# Altium footprint library 13-IC Packages-1bga1.PcbLib: 72 footprints (part 1 of 6) (continued)
## 424 CSP [mil] "QSC-60X5" (continued)
  round 10 smd mask+0: A12(-216.53,0) A14(-216.53,39.37) A23(-216.53,216.54) AB21(196.85,177.16) AC16(216.54,78.74) AC17(216.54,98.42) AC19(216.54,137.79) B12(-196.85,0) B14(-196.85,39.37) B15(-196.85,59.05) B16(-196.85,78.74) B17(-196.85,98.43) B18(-196.85,118.11) B19(-196.85,137.8) B20(-196.85,157.48) B22(-196.85,196.85) C19(-177.16,137.8) D22(-157.48,196.85) E12(-137.79,0) E14(-137.79,39.37) E19(-137.79,137.8) E22(-137.79,196.85) F11(-118.11,-19.68) F12(-118.11,0) F15(-118.11,59.06) F19(-118.11,137.8) F22(-118.11,196.85) H9(-78.74,-59.05) H10(-78.74,-39.37) H11(-78.74,-19.68) H12(-78.74,0) H13(-78.74,19.69) H14(-78.74,39.37) H15(-78.74,59.06) H19(-78.74,137.79) J6(-59.06,-118.11) J8(-59.05,-78.74) J9(-59.05,-59.05) J10(-59.05,-39.37) J11(-59.05,-19.68) J12(-59.05,0) J13(-59.05,19.69) J14(-59.05,39.37) J15(-59.05,59.06) J18(-59.05,118.11) J22(-59.05,196.85) K6(-39.37,-118.11) K9(-39.37,-59.05) K10(-39.37,-39.37) K11(-39.37,-19.68) K12(-39.37,0) K13(-39.37,19.69) K14(-39.37,39.37) K15(-39.37,59.06) K19(-39.37,137.79) L6(-19.69,-118.11) L9(-19.68,-59.05) L11(-19.68,-19.68) L12(-19.68,0) L13(-19.68,19.69) L14(-19.68,39.37) L15(-19.68,59.06) L22(-19.68,196.85) M10(0,-39.37) M11(0,-19.68) M12(0,0) M13(0,19.69) M14(0,39.37) M15(0,59.05) N6(19.68,-118.11) N10(19.68,-39.37) N11(19.68,-19.68) N12(19.68,0) N13(19.68,19.69) N14(19.68,39.37) N15(19.68,59.05) N16(19.68,78.74) N19(19.69,137.79) P8(39.37,-78.74) P9(39.37,-59.06) P10(39.37,-39.37) P11(39.37,-19.69) P13(39.37,19.68) P14(39.37,39.37) P15(39.37,59.05) R8(59.05,-78.74) R9(59.05,-59.06) R10(59.05,-39.37) R11(59.05,-19.69) R14(59.05,39.37) R15(59.05,59.05) R16(59.05,78.74) T8(78.74,-78.74) T9(78.74,-59.06) T10(78.74,-39.37) T11(78.74,-19.69) T14(78.74,39.37) T15(78.74,59.05) T16(78.74,78.74) T18(78.74,118.11)
Top Overlay:
  circle w1: c-204.18,-203 r9.12
  lines w1: -236.22,-236.22 -236.22,236.22 236.22,236.22 236.22,-236.22 -236.22,-236.22
3D body "424_csp.stp": height 39.76, standoff 0, extent -236,-236.22 236.44,236.22

## 432 CSP [mm]
height 0.75
pads (436):
  oval 0.28x0.25 smd mask+0.051: A1(-4.8,-4.8) A2(-4.8,-4.4) A3(-4.8,-4) A4(-4.8,-3.6) A5(-4.8,-3.2) A6(-4.8,-2.8) A7(-4.8,-2.75) A8(-4.8,-2) A9(-4.8,-1.6) A10(-4.8,-1.2) A11(-4.8,-0.8) A12(-4.8,-0.4) A13(-4.8,0) A14(-4.8,0.4) A15(-4.8,0.8) A16(-4.8,1.2) A17(-4.8,1.6) A18(-4.8,2) A19(-4.8,2.75) A20(-4.8,2.8) A21(-4.8,3.2) A22(-4.8,3.6) A23(-4.8,4) A24(-4.8,4.4) A25(-4.8,4.8) AA2(3.2,-4.4) AA4(3.2,-3.6) AA6(3.2,-2.8) AA7(3.2,-2.75) AA8(3.2,-2) AA9(3.2,-1.6) AA10(3.2,-1.2) AA11(3.2,-0.8) AA12(3.2,-0.4) AA13(3.2,0) AA14(3.2,0.4) AA15(3.2,0.8) AA16(3.2,1.2) AA17(3.2,1.6) AA18(3.2,2) AA19(3.2,2.75) AA20(3.2,2.8) AA21(3.2,3.2) AA22(3.2,3.6) AA24(3.2,4.4) AB2(3.6,-4.4) AB4(3.6,-3.6) AB5(3.6,-3.2) AB6(3.6,-2.8) AB7(3.6,-2.75) AB8(3.6,-2) AB9(3.6,-1.6) AB10(3.6,-1.2) AB11(3.6,-0.8) AB12(3.6,-0.4) AB13(3.6,0) AB14(3.6,0.4) AB15(3.6,0.8) AB16(3.6,1.2) AB17(3.6,1.6) AB18(3.6,2) AB19(3.6,2.75) AB20(3.6,2.8) AB21(3.6,3.2) AB22(3.6,3.6) AB24(3.6,4.4) AC2(4,-4.4) AC24(4,4.4) AD1(4.4,-4.8) AD2(4.4,-4.4) AD3(4.4,-4) AD4(4.4,-3.6) AD5(4.4,-3.2) AD6(4.4,-2.8) AD7(4.4,-2.75) AD8(4.4,-2) AD9(4.4,-1.6) AD10(4.4,-1.2) AD11(4.4,-0.8) AD12(4.4,-0.4) AD13(4.4,0) AD14(4.4,0.4) AD15(4.4,0.8) AD16(4.4,1.2) AD17(4.4,1.6) AD18(4.4,2) AD19(4.4,2.75) AD20(4.4,2.8) AD21(4.4,3.2) AD22(4.4,3.6) AD23(4.4,4) AD24(4.4,4.4) AE1(4.8,-4.8) AE2(4.8,-4.4) AE3(4.8,-4) AE4(4.8,-3.6) AE5(4.8,-3.2) AE6(4.8,-2.8) AE7(4.8,-2.75) AE8(4.8,-2) AE9(4.8,-1.6) AE10(4.8,-1.2) AE11(4.8,-0.8) AE12(4.8,-0.4) AE13(4.8,0) AE14(4.8,0.4) AE15(4.8,0.8) AE16(4.8,1.2) AE17(4.8,1.6) AE18(4.8,2) AE19(4.8,2.75) AE20(4.8,2.8) AE21(4.8,3.2) AE22(4.8,3.6) AE23(4.8,4) AE24(4.8,4.4) B2(-4.4,-4.4) B3(-4.4,-4) B4(-4.4,-3.6) B5(-4.4,-3.2) B6(-4.4,-2.8) B7(-4.4,-2.75) B8(-4.4,-2) B9(-4.4,-1.6) B10(-4.4,-1.2) B11(-4.4,-0.8) B12(-4.4,-0.4) B13(-4.4,0) B14(-4.4,0.4) B15(-4.4,0.8) B16(-4.4,1.2) B17(-4.4,1.6) B18(-4.4,2) B19(-4.4,2.75) B20(-4.4,2.8) B21(-4.4,3.2) B22(-4.4,3.6) B23(-4.4,4) B24(-4.4,4.4) C2(-4,-4.4) C24(-4,4.4) D2(-3.6,-4.4) D4(-3.6,-3.6) D5(-3.6,-3.2) D6(-3.6,-2.8) D7(-3.6,-2.75) D8(-3.6,-2) D9(-3.6,-1.6) D10(-3.6,-1.2) D11(-3.6,-0.8) D12(-3.6,-0.4) D13(-3.6,0) D14(-3.6,0.4) D15(-3.6,0.8) D16(-3.6,1.2) D17(-3.6,1.6) D18(-3.6,2) D19(-3.6,2.75) D20(-3.6,2.8) D22(-3.6,3.6) D24(-3.6,4.4) E2(-3.2,-4.4) E4(-3.2,-3.6) E6(-3.2,-2.8) E7(-3.2,-2.75) E8(-3.2,-2) E9(-3.2,-1.6) E10(-3.2,-1.2) E11(-3.2,-0.8) E12(-3.2,-0.4) E13(-3.2,0) E14(-3.2,0.4) E15(-3.2,0.8) E16(-3.2,1.2) E17(-3.2,1.6) E18(-3.2,2) E19(-3.2,2.75) E20(-3.2,2.8) E21(-3.2,3.2) E22(-3.2,3.6) E24(-3.2,4.4) F2(-2.8,-4.4) F4(-2.8,-3.6) F22(-2.8,3.6) F23(-2.8,4.4) G2(-2.75,-4.4) G4(-2.75,-3.6) G7(-2.75,-2.75) G9(-2.75,-1.6) G10(-2.75,-1.2) G11(-2.75,-0.8) G12(-2.75,-0.4) G13(-2.75,0) G14(-2.75,0.4) G15(-2.75,0.8) G16(-2.75,1.2) G17(-2.75,1.6) G19(-2.75,2.75) G22(-2.75,3.6) G24(-2.75,4.4) H2(-2,-4.4) H4(-2,-3.6) H7(-2,-2.75) H8(-2,-2) H9(-2,-1.6) H10(-2,-1.2) H11(-2,-0.8) H12(-2,-0.4) H13(-2,0) H14(-2,0.4) H15(-2,0.8) H16(-2,1.2) H17(-2,1.6) H18(-2,2) H19(-2,2.75) H22(-2,3.6) H24(-2,4.4) J2(-1.6,-4.4) J4(-1.6,-3.6) J7(-1.6,-2.75) J19(-1.6,2.75) J22(-1.6,3.6) J24(-1.6,4.4) K2(-1.2,-4.4) K4(-1.2,-3.6) K7(-1.2,-2.75) K19(-1.2,2.75) K22(-1.2,3.6) K24(-1.2,4.4) L2(-0.8,-4.4) L4(-0.8,-3.6) L7(-0.8,-2.75) L12(-0.8,-0.4) L13(-0.8,0) L14(-0.8,0.4) L15(-0.8,0.8) L19(-0.8,2.75) L22(-0.8,3.6) L24(-0.8,4.4) M2(-0.4,-4.4) M4(-0.4,-3.6) M7(-0.4,-2.75) M11(-0.4,-0.8) M12(-0.4,-0.4) M13(-0.4,0) M14(-0.4,0.4) M15(-0.4,0.8) M19(-0.4,2.75) M22(-0.4,3.6) M24(-0.4,4.4) N2(0,-4.4) N4(0,-3.6) N7(0,-2.75) N11(0,-0.8) N12(0,-0.4) N13(0,0) N14(0,0.4) N15(0,0.8) N19(0,2.75) N22(0,3.6) N24(0,4.4) P2(0.4,-4.4) P4(0.4,-3.6) P7(0.4,-2.75) P11(0.4,-0.8) P12(0.4,-0.4) P13(0.4,0) P14(0.4,0.4) P15(0.4,0.8) P19(0.4,2.75) P22(0.4,3.6) P24(0.4,4.4) R2(0.8,-4.4) R4(0.8,-3.6) R7(0.8,-2.75) R11(0.8,-0.8) R12(0.8,-0.4) R13(0.8,0) R14(0.8,0.4) R15(0.8,0.8) R19(0.8,2.75) R22(0.8,3.6) R24(0.8,4.4) T2(1.2,-4.4) T4(1.2,-3.6) T7(1.2,-2.75) T19(1.2,2.75) T22(1.2,3.6) T24(1.2,4.4) U2(1.6,-4.4) U4(1.6,-3.6) U7(1.6,-2.75) U19(1.6,2.75) U22(1.6,3.6) U24(1.6,4.4) V2(2,-4.4) V4(2,-3.6) V7(2,-2.75) V8(2,-2) V9(2,-1.6) V10(2,-1.2) V11(2,-0.8) V12(2,-0.4) V13(2,0) V14(2,0.4) V15(2,0.8) V16(2,1.2) V17(2,1.6) V19(2,2.75) V22(2,3.6) V24(2,4.4) W2(2.75,-4.4) W4(2.75,-3.6) W7(2.75,-2.75) W8(2.75,-2) W9(2.75,-1.6) W10(2.75,-1.2) W11(2.75,-0.8) W12(2.75,-0.4) W13(2.75,0) W14(2.75,0.4) W15(2.75,0.8) W16(2.75,1.2) W17(2.75,1.6) W18(2.75,2) W19(2.75,2.75) W22(2.75,3.6) W24(2.75,4.4) Y2(2.8,-4.4) Y4(2.8,-3.6) Y22(2.8,3.6) Y24(2.8,4.4)
  oval 0.25x0.28 smd mask+0.051: AA1(3.2,-4.8) AA5(3.2,-3.2) AA25(3.2,4.8) AB1(3.6,-4.8) AB25(3.6,4.8) AC1(4,-4.8) AC25(4,4.8) AD25(4.4,4.8) AE25(4.8,4.8) B1(-4.4,-4.8) B25(-4.4,4.8) C1(-4,-4.8) C25(-4,4.8) D1(-3.6,-4.8) D21(-3.6,3.2) D25(-3.6,4.8) E1(-3.2,-4.8) E5(-3.2,-3.2) E25(-3.2,4.8) F1(-2.8,-4.8) F5(-2.8,-3.2) F21(-2.8,3.2) F25(-2.8,4.8) G1(-2.75,-4.8) G5(-2.75,-3.2) G8(-2.75,-2) G18(-2.75,2) G21(-2.75,3.2) G25(-2.75,4.8) H1(-2,-4.8) H5(-2,-3.2) H21(-2,3.2) H25(-2,4.8) J1(-1.6,-4.8) J5(-1.6,-3.2) J8(-1.6,-2) J18(-1.6,2) J21(-1.6,3.2) J25(-1.6,4.8) K1(-1.2,-4.8) K5(-1.2,-3.2) K8(-1.2,-2) K18(-1.2,2) K21(-1.2,3.2) K25(-1.2,4.8) L1(-0.8,-4.8) L5(-0.8,-3.2) L8(-0.8,-2) L18(-0.8,2) L21(-0.8,3.2) L25(-0.8,4.8) M1(-0.4,-4.8) M5(-0.4,-3.2) M8(-0.4,-2) M18(-0.4,2) M21(-0.4,3.2) M25(-0.4,4.8) N1(0,-4.8) N5(0,-3.2) N8(0,-2) N18(0,2) N21(0,3.2) N25(0,4.8) P1(0.4,-4.8) P5(0.4,-3.2) P8(0.4,-2) P18(0.4,2) P21(0.4,3.2) P25(0.4,4.8) R1(0.8,-4.8) R5(0.8,-3.2) R8(0.8,-2) R18(0.8,2) R21(0.8,3.2) R25(0.8,4.8) T1(1.2,-4.8) T5(1.2,-3.2) T8(1.2,-2) T18(1.2,2) T21(1.2,3.2) T25(1.2,4.8) U1(1.6,-4.8) U5(1.6,-3.2) U8(1.6,-2) U18(1.6,2) U21(1.6,3.2) U25(1.6,4.8) V1(2,-4.8) V5(2,-3.2) V18(2,2) V21(2,3.2) V25(2,4.8) W1(2.75,-4.8) W5(2.75,-3.2) W21(2.75,3.2) W25(2.75,4.8) Y1(2.8,-4.8) Y5(2.8,-3.2) Y21(2.8,3.2) Y25(2.8,4.8)
  rect 0.178x0.978 smd mask+0.051: ""(-5.639,-5.232) ""(5.639,5.232)
  rect 0.978x0.178 smd mask+0.051: ""(-5.232,-5.639) ""(5.207,5.639)
Top Overlay:
  circle w0.025: c-4.804,-4.801 r0.232
  lines w0.025: -5.5,-5.5 5.5,-5.5 5.5,5.5 -5.5,5.5 -5.5,-5.5
3D body "BGA74C100P11X11_1200X1200X170.stp": height 1.7, standoff 0, extent -6,-6 6,6

## 543 BLL [mm] "MSM7200"
height 0.75
pads (543):
  round 0.285 smd: A1(-6.75,-6.75) A2(-6.75,-6.25) A3(-6.75,-5.75) A4(-6.75,-5.25) A5(-6.75,-4.75) A6(-6.75,-4.25) A7(-6.75,-3.75) A8(-6.75,-3.25) A9(-6.75,-2.75) A10(-6.75,-2.25) A11(-6.75,-1.75) A12(-6.75,-1.25) A13(-6.75,-0.75) A14(-6.75,-0.25) A15(-6.75,0.25) A16(-6.75,0.75) A17(-6.75,1.25) A18(-6.75,1.75) A19(-6.75,2.25) A20(-6.75,2.75) A21(-6.75,3.25) A22(-6.75,3.75) A23(-6.75,4.25) A24(-6.75,4.75) A25(-6.75,5.25) A26(-6.75,5.75) A27(-6.75,6.25) A28(-6.75,6.75) AA1(3.25,-6.75) AA2(3.25,-6.25) AA4(3.25,-5.25) AA5(3.25,-4.75) AA7(3.25,-3.75) AA8(3.25,-3.25) AA9(3.25,-2.75) AA10(3.25,-2.25) AA11(3.25,-1.75) AA12(3.25,-1.25) AA13(3.25,-0.75) AA14(3.25,-0.25) AA15(3.25,0.25) AA16(3.25,0.75) AA17(3.25,1.25) AA18(3.25,1.75) AA19(3.25,2.25) AA20(3.25,2.75) AA21(3.25,3.25) AA22(3.25,3.75) AA24(3.25,4.75) AA25(3.25,5.25) AA27(3.234,6.269) AA28(3.25,6.75) AB1(3.75,-6.75) AB2(3.75,-6.25) AB4(3.75,-5.25) AB5(3.75,-4.75) AB7(3.75,-3.75) AB8(3.75,-3.25) AB9(3.75,-2.75) AB10(3.75,-2.25) AB11(3.75,-1.75) AB12(3.75,-1.25) AB13(3.75,-0.75) AB14(3.75,-0.25) AB15(3.75,0.25) AB16(3.75,0.75) AB17(3.75,1.25) AB18(3.75,1.75) AB19(3.75,2.25) AB20(3.75,2.75) AB21(3.75,3.25) AB22(3.75,3.75) AB24(3.75,4.75) AB25(3.75,5.25) AB27(3.75,6.25) AB28(3.75,6.75) AC1(4.25,-6.75) AC2(4.25,-6.25) AC4(4.25,-5.25) AC5(4.25,-4.75) AC24(4.25,4.75) AC25(4.25,5.25) AC27(4.25,6.25) AC28(4.25,6.75) AD1(4.75,-6.75) AD2(4.75,-6.25) AD4(4.75,-5.25) AD5(4.75,-4.75) AD6(4.75,-4.25) AD7(4.75,-3.75) AD8(4.75,-3.25) AD9(4.75,-2.75) AD10(4.75,-2.25) AD11(4.75,-1.75) AD12(4.75,-1.25) AD13(4.75,-0.75) AD14(4.75,-0.25) AD15(4.75,0.25) AD16(4.75,0.75) AD17(4.75,1.25) AD18(4.75,1.75) AD19(4.75,2.25) AD20(4.75,2.75) AD21(4.75,3.25) AD22(4.75,3.75) AD23(4.75,4.25) AD24(4.75,4.75) AD25(4.75,5.25) AD27(4.75,6.25) AD28(4.75,6.75) AE1(5.25,-6.75) AE2(5.25,-6.25) AE4(5.25,-5.25) AE5(5.25,-4.75) AE6(5.25,-4.25) AE7(5.25,-3.75) AE8(5.25,-3.25) AE9(5.25,-2.75) AE10(5.25,-2.25) AE11(5.25,-1.75) AE12(5.25,-1.25) AE13(5.25,-0.75) AE14(5.25,-0.25) AE15(5.25,0.25) AE16(5.25,0.75) AE17(5.25,1.25) AE18(5.25,1.75) AE19(5.25,2.25) AE20(5.25,2.75) AE21(5.25,3.25) AE22(5.25,3.75) AE23(5.25,4.25) AE24(5.25,4.75) AE25(5.25,5.25) AE27(5.25,6.25) AE28(5.25,6.75) AF1(5.75,-6.75) AF2(5.75,-6.25) AF27(5.75,6.25) AF28(5.75,6.75) AG1(6.25,-6.75) AG2(6.25,-6.25) AG3(6.25,-5.75) AG4(6.25,-5.25) AG5(6.25,-4.75) AG6(6.25,-4.25) AG7(6.25,-3.75) AG8(6.25,-3.25) AG9(6.25,-2.75) AG10(6.25,-2.25) AG11(6.25,-1.75) AG12(6.25,-1.25) AG13(6.25,-0.75) AG14(6.25,-0.25) AG15(6.25,0.25) AG16(6.25,0.75) AG17(6.25,1.25) AG18(6.25,1.75) AG19(6.25,2.25) AG20(6.25,2.75) AG21(6.25,3.25) AG22(6.25,3.75) AG23(6.25,4.25) AG24(6.25,4.75) AG25(6.25,5.25) AG26(6.25,5.75) AG27(6.25,6.25) AG28(6.25,6.75) AH1(6.75,-6.75) AH2(6.75,-6.25) AH3(6.75,-5.75) AH4(6.75,-5.25) AH5(6.75,-4.75) AH6(6.75,-4.25) AH7(6.75,-3.75) AH8(6.75,-3.25) AH9(6.75,-2.75) AH10(6.75,-2.25) AH11(6.75,-1.75) AH12(6.75,-1.25) AH13(6.75,-0.75) AH14(6.75,-0.25) AH15(6.75,0.25) AH16(6.75,0.75) AH17(6.75,1.25) AH18(6.75,1.75) AH19(6.75,2.25) AH20(6.75,2.75) AH21(6.75,3.25) AH22(6.75,3.75) AH23(6.75,4.25) AH24(6.75,4.75) AH25(6.75,5.25) AH26(6.75,5.75) AH27(6.75,6.25) AH28(6.75,6.75) B1(-6.25,-6.75) B2(-6.25,-6.25) B3(-6.25,-5.75) B4(-6.25,-5.25) B5(-6.25,-4.75) B6(-6.25,-4.25) B7(-6.25,-3.75) B8(-6.25,-3.25) B9(-6.25,-2.75) B10(-6.25,-2.25) B11(-6.25,-1.75) B12(-6.25,-1.25) B13(-6.25,-0.75) B14(-6.25,-0.25) B15(-6.25,0.25) B16(-6.25,0.75) B17(-6.25,1.25) B18(-6.25,1.75) B19(-6.25,2.25) B20(-6.25,2.75) B21(-6.25,3.25) B22(-6.25,3.75) B23(-6.25,4.25) B24(-6.25,4.75) B25(-6.25,5.25) B26(-6.25,5.75) B27(-6.25,6.25) B28(-6.25,6.75) C1(-5.75,-6.75) C2(-5.75,-6.25) C28(-5.75,6.75) D1(-5.25,-6.75) D2(-5.25,-6.25) D4(-5.25,-5.25) D5(-5.25,-4.75) D6(-5.25,-4.25) D7(-5.25,-3.75) D8(-5.25,-3.25) D9(-5.25,-2.75) D10(-5.25,-2.25) D11(-5.25,-1.75) D12(-5.25,-1.25) D13(-5.25,-0.75) D14(-5.25,-0.25) D15(-5.25,0.25) D16(-5.25,0.75) D17(-5.25,1.25) D18(-5.25,1.75) D19(-5.25,2.25) D20(-5.25,2.75) D21(-5.25,3.25) D22(-5.25,3.75) D23(-5.25,4.25) D24(-5.25,4.75) D25(-5.25,5.25) D27(-5.25,6.25) D28(-5.25,6.75) E1(-4.75,-6.75) E2(-4.75,-6.25) E4(-4.75,-5.25) E5(-4.75,-4.75) E6(-4.75,-4.25) E7(-4.75,-3.75) E8(-4.75,-3.25) E9(-4.75,-2.75) E10(-4.75,-2.25) E11(-4.75,-1.75) E12(-4.75,-1.25) E13(-4.75,-0.75) E14(-4.75,-0.25) E15(-4.75,0.262) E16(-4.75,0.75) E17(-4.75,1.25) E18(-4.75,1.75) E19(-4.75,2.25) E20(-4.75,2.75) E21(-4.75,3.25) E22(-4.75,3.75) E23(-4.75,4.25) E24(-4.75,4.75) E25(-4.75,5.25) E27(-4.75,6.25) E28(-4.75,6.75) F1(-4.25,-6.75) F2(-4.25,-6.25) F4(-4.25,-5.25) F5(-4.25,-4.75) F24(-4.25,4.75) F25(-4.25,5.25) F27(-4.25,6.25) F28(-4.25,6.75) G1(-3.75,-6.75) G2(-3.75,-6.25) G4(-3.75,-5.25) G5(-3.75,-4.75) G7(-3.75,-3.75) G8(-3.75,-3.25) G9(-3.75,-2.75) G10(-3.75,-2.25) G11(-3.75,-1.75) G12(-3.75,-1.25) G13(-3.75,-0.75) G14(-3.75,-0.25) G15(-3.75,0.25) G16(-3.75,0.75) G17(-3.75,1.25) G18(-3.75,1.75) G19(-3.75,2.25) G20(-3.75,2.75) G21(-3.75,3.25) G22(-3.75,3.75) G24(-3.75,4.75) G25(-3.75,5.25) G27(-3.75,6.25) G28(-3.75,6.75) H1(-3.25,-6.75) H2(-3.25,-6.25) H4(-3.25,-5.25) H5(-3.25,-4.75) H7(-3.25,-3.75) H8(-3.25,-3.25) H9(-3.25,-2.75) H10(-3.25,-2.25) H11(-3.25,-1.75) H12(-3.25,-1.25) H13(-3.25,-0.75) H14(-3.25,-0.25) H15(-3.25,0.25) H16(-3.25,0.75) H17(-3.25,1.25) H18(-3.25,1.75) H20(-3.25,2.75) H21(-3.25,3.25) H22(-3.25,3.75) H24(-3.25,4.75) H25(-3.25,5.25) H27(-3.25,6.25) H28(-3.25,6.75) J1(-2.75,-6.75) J2(-2.75,-6.25) J4(-2.75,-5.25) J5(-2.75,-4.75) J7(-2.75,-3.75) J8(-2.75,-3.25) J21(-2.75,3.25) J22(-2.75,3.75) J24(-2.75,4.75) J25(-2.75,5.25) J27(-2.75,6.25) J28(-2.75,6.75) K1(-2.25,-6.75) K2(-2.25,-6.25) K4(-2.25,-5.25) K5(-2.25,-4.75) K7(-2.25,-3.75) K8(-2.25,-3.25) K21(-2.25,3.25) K22(-2.25,3.75) K24(-2.25,4.75) K25(-2.25,5.25) K27(-2.25,6.25) K28(-2.25,6.75) L1(-1.75,-6.75) L2(-1.75,-6.25) L4(-1.75,-5.25) L5(-1.75,-4.75) L7(-1.75,-3.75) L8(-1.75,-3.25) L12(-1.75,-1.25) L13(-1.75,-0.75) L14(-1.75,-0.25) L15(-1.75,0.25) L16(-1.75,0.75) L17(-1.75,1.25) L18(-1.75,1.75) L21(-1.75,3.25) L22(-1.75,3.75) L24(-1.75,4.75) L25(-1.75,5.25) L27(-1.75,6.25) L28(-1.75,6.75) M1(-1.25,-6.75) M2(-1.25,-6.25) M4(-1.25,-5.25) M5(-1.25,-4.75) M7(-1.25,-3.75) M8(-1.25,-3.25) M11(-1.25,-1.75) M12(-1.25,-1.25) M13(-1.25,-0.75) M14(-1.25,-0.25) M15(-1.25,0.25) M16(-1.25,0.75) M17(-1.25,1.25) M18(-1.25,1.75) M21(-1.25,3.25) M22(-1.25,3.75) M24(-1.25,4.75) M25(-1.25,5.25) M27(-1.25,6.25) M28(-1.25,6.75) N1(-0.75,-6.75) N2(-0.75,-6.25) N4(-0.75,-5.25) N5(-0.75,-4.75) N7(-0.75,-3.75) N8(-0.75,-3.25) N11(-0.75,-1.75) N12(-0.75,-1.25) N13(-0.75,-0.75) N14(-0.75,-0.25) N15(-0.75,0.25) N16(-0.75,0.75) N17(-0.75,1.25) N18(-0.75,1.75) N21(-0.75,3.25) N22(-0.75,3.75) N24(-0.75,4.75) N25(-0.75,5.25) N27(-0.75,6.25) N28(-0.75,6.75) P1(-0.25,-6.75) P2(-0.25,-6.25) P4(-0.25,-5.25) P5(-0.25,-4.75) P7(-0.25,-3.75) P8(-0.25,-3.25) P11(-0.25,-1.75) P12(-0.25,-1.25) P13(-0.25,-0.75) P14(-0.25,-0.25) P15(-0.25,0.25) P16(-0.25,0.75) P17(-0.25,1.25) P18(-0.25,1.75) P21(-0.25,3.25) P22(-0.25,3.75) P24(-0.25,4.75) P25(-0.25,5.25) P27(-0.25,6.25) P28(-0.25,6.75) R1(0.25,-6.75) R2(0.25,-6.25) R4(0.25,-5.25) R5(0.25,-4.75) R7(0.25,-3.75) R8(0.25,-3.25) R11(0.25,-1.75) R12(0.25,-1.25) R13(0.25,-0.75) R14(0.25,-0.25) R15(0.25,0.25) R16(0.25,0.75) R17(0.25,1.25) R18(0.25,1.75) R21(0.25,3.25) R22(0.25,3.75) R24(0.25,4.75) R25(0.25,5.25) R27(0.25,6.25) R28(0.25,6.75) T1(0.75,-6.75) T2(0.75,-6.25) T4(0.75,-5.25) T5(0.75,-4.75) T7(0.75,-3.75) T8(0.75,-3.25) T11(0.75,-1.75) T12(0.75,-1.25) T13(0.75,-0.75) T14(0.75,-0.25) T15(0.75,0.25) T16(0.75,0.75) T17(0.75,1.25) T18(0.75,1.75) T21(0.75,3.25) T22(0.75,3.75) T24(0.75,4.75) T25(0.75,5.25) T27(0.75,6.25) T28(0.75,6.75) U1(1.25,-6.75) U2(1.25,-6.25) U4(1.25,-5.25) U5(1.25,-4.75) U7(1.25,-3.75) U8(1.25,-3.25) U11(1.25,-1.75) U12(1.25,-1.25) U13(1.25,-0.75) U14(1.25,-0.25) U15(1.25,0.25) U16(1.25,0.75) U17(1.25,1.25) U18(1.25,1.75) U21(1.25,3.25) U22(1.25,3.75) U24(1.25,4.75) U25(1.25,5.25) U27(1.25,6.25) U28(1.25,6.75) V1(1.75,-6.75) V2(1.75,-6.25) V4(1.75,-5.25) V5(1.75,-4.75) V7(1.75,-3.75) V8(1.75,-3.25) V11(1.75,-1.75) V12(1.75,-1.25) V13(1.75,-0.75) V14(1.75,-0.25) V15(1.75,0.25) V16(1.75,0.75) V17(1.75,1.25) V18(1.75,1.75) V21(1.75,3.25) V22(1.75,3.75) V24(1.75,4.75) V25(1.75,5.25) V27(-5.75,6.25) V27(1.75,6.25) V28(1.75,6.75) W1(2.25,-6.75) W2(2.25,-6.25) W4(2.25,-5.25) W5(2.25,-4.75) W7(2.25,-3.75) W8(2.25,-3.25) W21(2.25,3.25) W22(2.25,3.75) W24(2.25,4.75) W25(2.25,5.25) W27(2.25,6.25) W28(2.25,6.75) Y1(2.75,-6.75) Y2(2.75,-6.25) Y4(2.75,-5.25) Y5(2.75,-4.75) Y7(2.75,-3.75) Y8(2.75,-3.25) Y21(2.75,3.25) Y22(2.75,3.75) Y24(2.75,4.75) Y25(2.75,5.25) Y27(2.75,6.25) Y28(2.75,6.75)
  round 0.285 smd mask+0.05: H19(-3.25,2.25)
Top Overlay:
  region: -7.5,-7.5 -6.738,-7.5 -7.5,-6.738
  lines w0.005: -7.5,-6.738 -6.738,-7.5 ; -7.5,-7.5 -7.5,7.5 7.5,7.5 7.5,-7.5 -7.5,-7.5
  lines w0.051: -7.671,-7.671 -7.671,7.671 7.671,7.671 7.671,-7.671 -7.671,-7.671
3D body "BGA324C80P18X18_1500X1500X120.stp": height 1.2, standoff 0, extent -7.5,-7.5 7.5,7.5

## BGA8C50P3X3_153X153X63 [mm] "BGA8C50P3X3_153X153X63"
height 23.14
pads (10):
  round 1 smd: " "(-1.85,-1.85) " "(1.85,1.85)
  round 0.35 smd: A1(-0.5,0.5) A2(0,0.5) A3(0.5,0.5) B1(-0.5,0) B3(0.5,0) C1(-0.5,-0.5) C2(0,-0.5) C3(0.5,-0.5)
Top Layer keep-out:
  circle w0.025: c-1.85,-1.85 r1
  circle w0.025: c-1.85,-1.85 r1
  circle w0.025: c1.85,1.85 r1
  circle w0.025: c1.85,1.85 r1
Top Overlay:
  circle w0.254: c-1.531,0.571 r0.279
  lines w0.152: -1,-1 -1,1 1,1 1,-1 -1,-1
Mechanical 16:
  circle w0.025: c-1.531,0.571 r0.279
  lines w0.025: -0.767,-0.767 -0.767,0.767 0.767,0.767 0.767,-0.767 -0.767,-0.767
Mechanical 32:
  text "C3" at 0.5,-1.02 h0.65
  text "B3" at 0.5,-0.52 h0.65
  text "B1" at -0.5,-0.52 h0.65
  text "C1" at -0.5,-1.02 h0.65
  text "A3" at 0.5,-0.02 h0.65
  text "C2" at 0,-1.02 h0.65
  text "A1" at -0.5,-0.02 h0.65
  text "A2" at 0,-0.02 h0.65
  text "1.5344" at -6.054,0.154 h0.76
  text ".0604" at -5.668,-0.657 h0.76
  text "0.5" at -0.93,4.202 h0.76
  text ".0197" at -1.576,3.391 h0.76
  text "0.5" at 4.029,-0.571 h0.76
  text ".0197" at 6.823,-0.571 h0.76
  text "1.5344" at -4.037,-3.537 h0.76
  text ".0604" at 0.434,-3.537 h0.76

## BGA16C100P4X4_400X400X140 [mm] "BGA, 1.00mm pitch, square; 16 pin, 4 columns X 4 rows, 4.00mm X 4.00mm"
height 1.4
pads (16):
  round 0.45 smd: A1(-1.5,1.5) A2(-0.5,1.5) A3(0.5,1.5) A4(1.5,1.5) B1(-1.5,0.5) B2(-0.5,0.5) B3(0.5,0.5) B4(1.5,0.5) C1(-1.5,-0.5) C2(-0.5,-0.5) C3(0.5,-0.5) C4(1.5,-0.5) D1(-1.5,-1.5) D2(-0.5,-1.5) D3(0.5,-1.5) D4(1.5,-1.5)
Top Overlay:
  circle w0.25: c-2.8,1.5 r0.125
  lines w0.2: -2.15,-2.15 2.15,-2.15 2.15,2.15 -2.15,2.15 -2.15,-2.15
Mechanical 14:
  lines w0.1: -2,1.3 -1.3,2 ; -2,1.4 -1.4,2 ; -2,1.5 -1.5,2 ; -2,1.6 -1.6,2 ; -2,1.7 -1.7,2 ; -2,1.8 -1.8,2 ; -2,1.9 -1.9,2 ; -2,-2 2,-2 2,2 -2,2 -2,-2
Mechanical 15:
  lines w0.05: -0.5,0 0.5,0 ; 0,-0.5 0,0.5 ; -3,-3 3,-3 3,3 -3,3 -3,-3
3D body "BGA16C100P4X4_400X400X140.stp": height 1.4, standoff 0, extent -2,-2 2,2

## BGA48C75P6X8_600X800X120 [mm] "BGA, 0.75mm Pitch, Rect.; 48 Pin, 6 Columns X 8 Rows, 6mm X 8mm X 1.20mm H, IPC Medium Density"
height 1.2
pads (50):
  round 0.35 smd: A1(-1.875,2.625) A2(-1.125,2.625) A3(-0.375,2.625) A4(0.375,2.625) A5(1.125,2.625) A6(1.875,2.625) B1(-1.875,1.875) B2(-1.125,1.875) B3(-0.375,1.875) B4(0.375,1.875) B5(1.125,1.875) B6(1.875,1.875) C1(-1.875,1.125) C2(-1.125,1.125) C3(-0.375,1.125) C4(0.375,1.125) C5(1.125,1.125) C6(1.875,1.125) D1(-1.875,0.375) D2(-1.125,0.375) D3(-0.375,0.375) D4(0.375,0.375) D5(1.125,0.375) D6(1.875,0.375) E1(-1.875,-0.375) E2(-1.125,-0.375) E3(-0.375,-0.375) E4(0.375,-0.375) E5(1.125,-0.375) E6(1.875,-0.375) F1(-1.875,-1.125) F2(-1.125,-1.125) F3(-0.375,-1.125) F4(0.375,-1.125) F5(1.125,-1.125) F6(1.875,-1.125) G1(-1.875,-1.875) G2(-1.125,-1.875) G3(-0.375,-1.875) G4(0.375,-1.875) G5(1.125,-1.875) G6(1.875,-1.875) H1(-1.875,-2.625) H2(-1.125,-2.625) H3(-0.375,-2.625) H4(0.375,-2.625) H5(1.125,-2.625) H6(1.875,-2.625)
  round 1 smd paste-0.51 mask+0.5: FTG1(-3.85,-4.85) FTG2(3.85,4.85)
Top Layer keep-out:
  circle w0.1: c3.85,4.85 r1
  circle w0.1: c-3.85,-4.85 r1
Top Overlay:
  circle w0.25: c-3.6,2.65 r0.125
  lines w0.2: -3,3 -2,4 ; -3,3.2 -2.2,4 ; -3,3.4 -2.4,4 ; -3,3.6 -2.6,4 ; -3,3.8 -2.8,4 ; -3,-4 -3,4 3,4 3,-4 -3,-4
Mechanical 14:
  lines w0.1: -3,3 -2,4 ; -3,3.1 -2.1,4 ; -3,3.2 -2.2,4 ; -3,3.3 -2.3,4 ; -3,3.4 -2.4,4 ; -3,3.5 -2.5,4 ; -3,3.6 -2.6,4 ; -3,3.7 -2.7,4 ; -3,3.8 -2.8,4 ; -3,3.9 -2.9,4 ; -3,-4 -3,4 3,4 3,-4 -3,-4
Mechanical 15:
  circle w0.05: c0,0 r0.35
  lines w0.05: -0.5,0 0.5,0 ; 0,-0.5 0,0.5 ; -4.05,-5.05 -4.05,5.05 4.05,5.05 4.05,-5.05 -4.05,-5.05
3D body "BGA48C75P6X8_600X800X120.stp": height 1.2, standoff 0, extent -3,-4 3,4